# Altium footprint library Connector_Samtec_HLE_THT.PcbLib: 141 footprints (part 8 of 9) (continued)
## Samtec_HLE-143-02-xx-DV-TE_2x43_P2.54mm_Horizontal [mm]
pads (86):
  rrect19% 1.31x1.31 hole 0.71: 1(0,0)
  round 1.31 hole 0.71: 2(0,-2.54) 3(2.54,0) 4(2.54,-2.54) 5(5.08,0) 6(5.08,-2.54) 7(7.62,0) 8(7.62,-2.54) 9(10.16,0) 10(10.16,-2.54) 11(12.7,0) 12(12.7,-2.54) 13(15.24,0) 14(15.24,-2.54) 15(17.78,0) 16(17.78,-2.54) 17(20.32,0) 18(20.32,-2.54) 19(22.86,0) 20(22.86,-2.54) 21(25.4,0) 22(25.4,-2.54) 23(27.94,0) 24(27.94,-2.54) 25(30.48,0) 26(30.48,-2.54) 27(33.02,0) 28(33.02,-2.54) 29(35.56,0) 30(35.56,-2.54) 31(38.1,0) 32(38.1,-2.54) 33(40.64,0) 34(40.64,-2.54) 35(43.18,0) 36(43.18,-2.54) 37(45.72,0) 38(45.72,-2.54) 39(48.26,0) 40(48.26,-2.54) 41(50.8,0) 42(50.8,-2.54) 43(53.34,0) 44(53.34,-2.54) 45(55.88,0) 46(55.88,-2.54) 47(58.42,0) 48(58.42,-2.54) 49(60.96,0) 50(60.96,-2.54) 51(63.5,0) 52(63.5,-2.54) 53(66.04,0) 54(66.04,-2.54) 55(68.58,0) 56(68.58,-2.54) 57(71.12,0) 58(71.12,-2.54) 59(73.66,0) 60(73.66,-2.54) 61(76.2,0) 62(76.2,-2.54) 63(78.74,0) 64(78.74,-2.54) 65(81.28,0) 66(81.28,-2.54) 67(83.82,0) 68(83.82,-2.54) 69(86.36,0) 70(86.36,-2.54) 71(88.9,0) 72(88.9,-2.54) 73(91.44,0) 74(91.44,-2.54) 75(93.98,0) 76(93.98,-2.54) 77(96.52,0) 78(96.52,-2.54) 79(99.06,0) 80(99.06,-2.54) 81(101.6,0) 82(101.6,-2.54) 83(104.14,0) 84(104.14,-2.54) 85(106.68,0) 86(106.68,-2.54)
F.SilkS:
  lines w0.12: -1.38,-3.92 108.06,-3.92 108.06,1.38 -1.38,1.38 -1.38,-3.92
F.CrtYd:
  lines w0.05: -1.77,-4.31 108.45,-4.31 108.45,1.77 -1.77,1.77 -1.77,-4.31
F.Fab:
  lines w0.1: -0.5,1.27 0,0.563 0.5,1.27 ; -1.27,-3.81 107.95,-3.81 107.95,1.27 -1.27,1.27 -1.27,-3.81
  text "'.Designator'" at 49.293,-3.95 h1

## Samtec_HLE-144-02-xx-DV-PE-LC_2x44_P2.54mm_Horizontal [mm]
pads (178):
  rrect19% 1.31x1.31 hole 0.71: 1(0,0)
  round 1.31 hole 0.71: 2(0,-7.62) 3(2.54,0) 4(2.54,-7.62) 5(5.08,0) 6(5.08,-7.62) 7(7.62,0) 8(7.62,-7.62) 9(10.16,0) 10(10.16,-7.62) 11(12.7,0) 12(12.7,-7.62) 13(15.24,0) 14(15.24,-7.62) 15(17.78,0) 16(17.78,-7.62) 17(20.32,0) 18(20.32,-7.62) 19(22.86,0) 20(22.86,-7.62) 21(25.4,0) 22(25.4,-7.62) 23(27.94,0) 24(27.94,-7.62) 25(30.48,0) 26(30.48,-7.62) 27(33.02,0) 28(33.02,-7.62) 29(35.56,0) 30(35.56,-7.62) 31(38.1,0) 32(38.1,-7.62) 33(40.64,0) 34(40.64,-7.62) 35(43.18,0) 36(43.18,-7.62) 37(45.72,0) 38(45.72,-7.62) 39(48.26,0) 40(48.26,-7.62) 41(50.8,0) 42(50.8,-7.62) 43(53.34,0) 44(53.34,-7.62) 45(55.88,0) 46(55.88,-7.62) 47(58.42,0) 48(58.42,-7.62) 49(60.96,0) 50(60.96,-7.62) 51(63.5,0) 52(63.5,-7.62) 53(66.04,0) 54(66.04,-7.62) 55(68.58,0) 56(68.58,-7.62) 57(71.12,0) 58(71.12,-7.62) 59(73.66,0) 60(73.66,-7.62) 61(76.2,0) 62(76.2,-7.62) 63(78.74,0) 64(78.74,-7.62) 65(81.28,0) 66(81.28,-7.62) 67(83.82,0) 68(83.82,-7.62) 69(86.36,0) 70(86.36,-7.62) 71(88.9,0) 72(88.9,-7.62) 73(91.44,0) 74(91.44,-7.62) 75(93.98,0) 76(93.98,-7.62) 77(96.52,0) 78(96.52,-7.62) 79(99.06,0) 80(99.06,-7.62) 81(101.6,0) 82(101.6,-7.62) 83(104.14,0) 84(104.14,-7.62) 85(106.68,0) 86(106.68,-7.62) 87(109.22,0) 88(109.22,-7.62)
  round 1.4 hole 1.4: Un1(0,-2.54) Un2(12.7,-5.08) Un3(48.26,-5.08) Un4(40.64,-5.08) Un5(66.04,-2.54) Un6(88.9,-2.54) Un7(91.44,-5.08) Un8(71.12,-5.08) Un9(78.74,-2.54) Un10(76.2,-2.54) Un11(10.16,-2.54) Un12(10.16,-5.08) Un13(33.02,-5.08) Un14(53.34,-2.54) Un15(38.1,-2.54) Un16(25.4,-5.08) Un17(93.98,-2.54) Un18(22.86,-2.54) Un19(83.82,-2.54) Un20(43.18,-2.54) Un21(88.9,-5.08) Un22(20.32,-5.08) Un23(81.28,-5.08) Un24(15.24,-5.08) Un25(17.78,-5.08) Un26(68.58,-5.08) Un27(86.36,-5.08) Un28(109.22,-5.08) Un29(86.36,-2.54) Un30(17.78,-2.54) Un31(68.58,-2.54) Un32(73.66,-2.54) Un33(106.68,-5.08) Un34(27.94,-2.54) Un35(109.22,-2.54) Un36(5.08,-5.08) Un37(7.62,-2.54) Un38(15.24,-2.54) Un39(7.62,-5.08) Un40(50.8,-5.08) Un41(30.48,-2.54) Un42(99.06,-2.54) Un43(58.42,-2.54) Un44(25.4,-2.54) Un45(33.02,-2.54) Un46(43.18,-5.08) Un47(93.98,-5.08) Un48(91.44,-2.54) Un49(40.64,-2.54) Un50(99.06,-5.08) Un51(55.88,-2.54) Un52(22.86,-5.08) Un53(60.96,-5.08) Un54(0,-5.08) Un55(106.68,-2.54) Un56(53.34,-5.08) Un57(101.6,-2.54) Un58(76.2,-5.08) Un59(63.5,-2.54) Un61(2.54,-2.54) Un62(45.72,-5.08) Un63(55.88,-5.08) Un64(58.42,-5.08) Un65(71.12,-2.54) Un66(96.52,-5.08) Un67(35.56,-2.54) Un68(60.96,-2.54) Un69(63.5,-5.08) Un70(12.7,-2.54) Un71(5.08,-2.54) Un72(38.1,-5.08) Un73(78.74,-5.08) Un74(2.54,-5.08) Un75(66.04,-5.08) Un76(104.14,-2.54) Un77(20.32,-2.54) Un78(27.94,-5.08) Un79(104.14,-5.08) Un80(48.26,-2.54) Un81(35.56,-5.08) Un83(81.28,-2.54) Un84(96.52,-2.54) Un85(83.82,-5.08) Un86(30.48,-5.08) Un87(45.72,-2.54) Un88(50.8,-2.54) Un89(73.66,-5.08) Un90(101.6,-5.08)
  round 1.19 hole 1.19: Un60(107.95,-3.81) Un82(1.27,-3.81)
F.SilkS:
  lines w0.12: -1.38,-6.46 -1.38,-1.16 110.6,-1.16 110.6,-6.46 -1.38,-6.46
F.CrtYd:
  lines w0.05: -1.77,-8.78 110.99,-8.78 110.99,1.16 -1.77,1.16 -1.77,-8.78
F.Fab:
  lines w0.1: -0.5,-1.27 0,-1.977 0.5,-1.27 ; -1.27,-6.35 -1.27,-1.27 110.49,-1.27 110.49,-6.35 -1.27,-6.35
  text "'.Designator'" at 50.563,-6.49 h1

## Samtec_HLE-144-02-xx-DV-PE_2x44_P2.54mm_Horizontal [mm]
pads (176):
  rrect19% 1.31x1.31 hole 0.71: 1(0,0)
  round 1.31 hole 0.71: 2(0,-7.62) 3(2.54,0) 4(2.54,-7.62) 5(5.08,0) 6(5.08,-7.62) 7(7.62,0) 8(7.62,-7.62) 9(10.16,0) 10(10.16,-7.62) 11(12.7,0) 12(12.7,-7.62) 13(15.24,0) 14(15.24,-7.62) 15(17.78,0) 16(17.78,-7.62) 17(20.32,0) 18(20.32,-7.62) 19(22.86,0) 20(22.86,-7.62) 21(25.4,0) 22(25.4,-7.62) 23(27.94,0) 24(27.94,-7.62) 25(30.48,0) 26(30.48,-7.62) 27(33.02,0) 28(33.02,-7.62) 29(35.56,0) 30(35.56,-7.62) 31(38.1,0) 32(38.1,-7.62) 33(40.64,0) 34(40.64,-7.62) 35(43.18,0) 36(43.18,-7.62) 37(45.72,0) 38(45.72,-7.62) 39(48.26,0) 40(48.26,-7.62) 41(50.8,0) 42(50.8,-7.62) 43(53.34,0) 44(53.34,-7.62) 45(55.88,0) 46(55.88,-7.62) 47(58.42,0) 48(58.42,-7.62) 49(60.96,0) 50(60.96,-7.62) 51(63.5,0) 52(63.5,-7.62) 53(66.04,0) 54(66.04,-7.62) 55(68.58,0) 56(68.58,-7.62) 57(71.12,0) 58(71.12,-7.62) 59(73.66,0) 60(73.66,-7.62) 61(76.2,0) 62(76.2,-7.62) 63(78.74,0) 64(78.74,-7.62) 65(81.28,0) 66(81.28,-7.62) 67(83.82,0) 68(83.82,-7.62) 69(86.36,0) 70(86.36,-7.62) 71(88.9,0) 72(88.9,-7.62) 73(91.44,0) 74(91.44,-7.62) 75(93.98,0) 76(93.98,-7.62) 77(96.52,0) 78(96.52,-7.62) 79(99.06,0) 80(99.06,-7.62) 81(101.6,0) 82(101.6,-7.62) 83(104.14,0) 84(104.14,-7.62) 85(106.68,0) 86(106.68,-7.62) 87(109.22,0) 88(109.22,-7.62)
  round 1.4 hole 1.4: Un1(35.56,-2.54) Un2(81.28,-2.54) Un3(91.44,-5.08) Un4(106.68,-5.08) Un5(17.78,-2.54) Un6(25.4,-2.54) Un7(27.94,-5.08) Un8(33.02,-5.08) Un9(5.08,-5.08) Un10(96.52,-5.08) Un11(33.02,-2.54) Un12(73.66,-2.54) Un13(7.62,-2.54) Un14(99.06,-5.08) Un15(0,-5.08) Un16(99.06,-2.54) Un17(43.18,-5.08) Un18(93.98,-5.08) Un19(53.34,-2.54) Un20(66.04,-5.08) Un21(60.96,-5.08) Un22(35.56,-5.08) Un23(86.36,-5.08) Un24(55.88,-5.08) Un25(30.48,-5.08) Un26(63.5,-2.54) Un27(86.36,-2.54) Un28(60.96,-2.54) Un29(20.32,-5.08) Un30(50.8,-5.08) Un31(58.42,-2.54) Un32(58.42,-5.08) Un33(83.82,-5.08) Un34(88.9,-2.54) Un35(2.54,-2.54) Un36(71.12,-2.54) Un37(66.04,-2.54) Un38(2.54,-5.08) Un39(22.86,-5.08) Un40(30.48,-2.54) Un41(78.74,-2.54) Un42(45.72,-2.54) Un43(12.7,-5.08) Un44(5.08,-2.54) Un45(38.1,-2.54) Un46(73.66,-5.08) Un47(22.86,-2.54) Un48(109.22,-5.08) Un49(101.6,-2.54) Un50(104.14,-5.08) Un51(0,-2.54) Un52(38.1,-5.08) Un53(78.74,-5.08) Un54(106.68,-2.54) Un55(25.4,-5.08) Un56(15.24,-2.54) Un57(76.2,-2.54) Un58(93.98,-2.54) Un59(40.64,-5.08) Un60(101.6,-5.08) Un61(88.9,-5.08) Un62(109.22,-2.54) Un63(17.78,-5.08) Un64(104.14,-2.54) Un65(27.94,-2.54) Un66(45.72,-5.08) Un67(48.26,-5.08) Un68(68.58,-5.08) Un69(50.8,-2.54) Un70(40.64,-2.54) Un71(81.28,-5.08) Un72(20.32,-2.54) Un73(10.16,-2.54) Un74(83.82,-2.54) Un75(12.7,-2.54) Un76(76.2,-5.08) Un77(63.5,-5.08) Un78(43.18,-2.54) Un79(68.58,-2.54) Un80(7.62,-5.08) Un81(71.12,-5.08) Un82(55.88,-2.54) Un83(15.24,-5.08) Un84(53.34,-5.08) Un85(96.52,-2.54) Un86(10.16,-5.08) Un87(91.44,-2.54) Un88(48.26,-2.54)
F.SilkS:
  lines w0.12: -1.38,-6.46 -1.38,-1.16 110.6,-1.16 110.6,-6.46 -1.38,-6.46
F.CrtYd:
  lines w0.05: -1.77,-8.78 110.99,-8.78 110.99,1.16 -1.77,1.16 -1.77,-8.78
F.Fab:
  lines w0.1: -0.5,-1.27 0,-1.977 0.5,-1.27 ; -1.27,-6.35 -1.27,-1.27 110.49,-1.27 110.49,-6.35 -1.27,-6.35
  text "'.Designator'" at 50.563,-6.49 h1

## Samtec_HLE-144-02-xx-DV-TE_2x44_P2.54mm_Horizontal [mm]
pads (88):
  rrect19% 1.31x1.31 hole 0.71: 1(0,0)
  round 1.31 hole 0.71: 2(0,-2.54) 3(2.54,0) 4(2.54,-2.54) 5(5.08,0) 6(5.08,-2.54) 7(7.62,0) 8(7.62,-2.54) 9(10.16,0) 10(10.16,-2.54) 11(12.7,0) 12(12.7,-2.54) 13(15.24,0) 14(15.24,-2.54) 15(17.78,0) 16(17.78,-2.54) 17(20.32,0) 18(20.32,-2.54) 19(22.86,0) 20(22.86,-2.54) 21(25.4,0) 22(25.4,-2.54) 23(27.94,0) 24(27.94,-2.54) 25(30.48,0) 26(30.48,-2.54) 27(33.02,0) 28(33.02,-2.54) 29(35.56,0) 30(35.56,-2.54) 31(38.1,0) 32(38.1,-2.54) 33(40.64,0) 34(40.64,-2.54) 35(43.18,0) 36(43.18,-2.54) 37(45.72,0) 38(45.72,-2.54) 39(48.26,0) 40(48.26,-2.54) 41(50.8,0) 42(50.8,-2.54) 43(53.34,0) 44(53.34,-2.54) 45(55.88,0) 46(55.88,-2.54) 47(58.42,0) 48(58.42,-2.54) 49(60.96,0) 50(60.96,-2.54) 51(63.5,0) 52(63.5,-2.54) 53(66.04,0) 54(66.04,-2.54) 55(68.58,0) 56(68.58,-2.54) 57(71.12,0) 58(71.12,-2.54) 59(73.66,0) 60(73.66,-2.54) 61(76.2,0) 62(76.2,-2.54) 63(78.74,0) 64(78.74,-2.54) 65(81.28,0) 66(81.28,-2.54) 67(83.82,0) 68(83.82,-2.54) 69(86.36,0) 70(86.36,-2.54) 71(88.9,0) 72(88.9,-2.54) 73(91.44,0) 74(91.44,-2.54) 75(93.98,0) 76(93.98,-2.54) 77(96.52,0) 78(96.52,-2.54) 79(99.06,0) 80(99.06,-2.54) 81(101.6,0) 82(101.6,-2.54) 83(104.14,0) 84(104.14,-2.54) 85(106.68,0) 86(106.68,-2.54) 87(109.22,0) 88(109.22,-2.54)
F.SilkS:
  lines w0.12: -1.38,-3.92 110.6,-3.92 110.6,1.38 -1.38,1.38 -1.38,-3.92
F.CrtYd:
  lines w0.05: -1.77,-4.31 110.99,-4.31 110.99,1.77 -1.77,1.77 -1.77,-4.31
F.Fab:
  lines w0.1: -0.5,1.27 0,0.563 0.5,1.27 ; -1.27,-3.81 110.49,-3.81 110.49,1.27 -1.27,1.27 -1.27,-3.81
  text "'.Designator'" at 50.563,-3.95 h1

## Samtec_HLE-145-02-xx-DV-PE-LC_2x45_P2.54mm_Horizontal [mm]
pads (182):
  rrect19% 1.31x1.31 hole 0.71: 1(0,0)
  round 1.31 hole 0.71: 2(0,-7.62) 3(2.54,0) 4(2.54,-7.62) 5(5.08,0) 6(5.08,-7.62) 7(7.62,0) 8(7.62,-7.62) 9(10.16,0) 10(10.16,-7.62) 11(12.7,0) 12(12.7,-7.62) 13(15.24,0) 14(15.24,-7.62) 15(17.78,0) 16(17.78,-7.62) 17(20.32,0) 18(20.32,-7.62) 19(22.86,0) 20(22.86,-7.62) 21(25.4,0) 22(25.4,-7.62) 23(27.94,0) 24(27.94,-7.62) 25(30.48,0) 26(30.48,-7.62) 27(33.02,0) 28(33.02,-7.62) 29(35.56,0) 30(35.56,-7.62) 31(38.1,0) 32(38.1,-7.62) 33(40.64,0) 34(40.64,-7.62) 35(43.18,0) 36(43.18,-7.62) 37(45.72,0) 38(45.72,-7.62) 39(48.26,0) 40(48.26,-7.62) 41(50.8,0) 42(50.8,-7.62) 43(53.34,0) 44(53.34,-7.62) 45(55.88,0) 46(55.88,-7.62) 47(58.42,0) 48(58.42,-7.62) 49(60.96,0) 50(60.96,-7.62) 51(63.5,0) 52(63.5,-7.62) 53(66.04,0) 54(66.04,-7.62) 55(68.58,0) 56(68.58,-7.62) 57(71.12,0) 58(71.12,-7.62) 59(73.66,0) 60(73.66,-7.62) 61(76.2,0) 62(76.2,-7.62) 63(78.74,0) 64(78.74,-7.62) 65(81.28,0) 66(81.28,-7.62) 67(83.82,0) 68(83.82,-7.62) 69(86.36,0) 70(86.36,-7.62) 71(88.9,0) 72(88.9,-7.62) 73(91.44,0) 74(91.44,-7.62) 75(93.98,0) 76(93.98,-7.62) 77(96.52,0) 78(96.52,-7.62) 79(99.06,0) 80(99.06,-7.62) 81(101.6,0) 82(101.6,-7.62) 83(104.14,0) 84(104.14,-7.62) 85(106.68,0) 86(106.68,-7.62) 87(109.22,0) 88(109.22,-7.62) 89(111.76,0) 90(111.76,-7.62)
  round 1.4 hole 1.4: Un1(111.76,-5.08) Un2(53.34,-2.54) Un3(55.88,-2.54) Un4(76.2,-2.54) Un5(0,-5.08) Un6(66.04,-2.54) Un7(38.1,-2.54) Un8(45.72,-5.08) Un9(35.56,-5.08) Un10(33.02,-2.54) Un11(7.62,-2.54) Un12(76.2,-5.08) Un13(101.6,-2.54) Un14(20.32,-2.54) Un15(50.8,-5.08) Un16(109.22,-5.08) Un17(68.58,-5.08) Un18(66.04,-5.08) Un19(15.24,-5.08) Un20(40.64,-2.54) Un21(50.8,-2.54) Un22(68.58,-2.54) Un23(99.06,-2.54) Un24(5.08,-5.08) Un25(27.94,-2.54) Un26(48.26,-5.08) Un27(2.54,-2.54) Un28(81.28,-5.08) Un29(93.98,-2.54) Un30(91.44,-5.08) Un31(12.7,-2.54) Un32(5.08,-2.54) Un33(45.72,-2.54) Un34(71.12,-2.54) Un35(93.98,-5.08) Un36(91.44,-2.54) Un37(106.68,-5.08) Un38(53.34,-5.08) Un39(58.42,-5.08) Un40(83.82,-5.08) Un41(30.48,-2.54) Un42(7.62,-5.08) Un43(2.54,-5.08) Un44(10.16,-5.08) Un45(15.24,-2.54) Un46(99.06,-5.08) Un47(17.78,-5.08) Un48(25.4,-2.54) Un49(106.68,-2.54) Un50(88.9,-2.54) Un51(22.86,-5.08) Un52(81.28,-2.54) Un53(63.5,-5.08) Un54(60.96,-2.54) Un55(109.22,-2.54) Un56(40.64,-5.08) Un57(35.56,-2.54) Un58(25.4,-5.08) Un59(111.76,-2.54) Un60(88.9,-5.08) Un61(86.36,-2.54) Un62(20.32,-5.08) Un63(0,-2.54) Un64(43.18,-5.08) Un65(27.94,-5.08) Un66(10.16,-2.54) Un68(60.96,-5.08) Un69(104.14,-2.54) Un70(86.36,-5.08) Un71(22.86,-2.54) Un72(43.18,-2.54) Un73(30.48,-5.08) Un74(55.88,-5.08) Un75(71.12,-5.08) Un76(96.52,-2.54) Un77(101.6,-5.08) Un78(78.74,-5.08) Un79(83.82,-2.54) Un80(17.78,-2.54) Un81(38.1,-5.08) Un82(73.66,-2.54) Un83(63.5,-2.54) Un84(33.02,-5.08) Un85(73.66,-5.08) Un87(48.26,-2.54) Un88(78.74,-2.54) Un89(96.52,-5.08) Un90(12.7,-5.08) Un91(104.14,-5.08) Un92(58.42,-2.54)
  round 1.19 hole 1.19: Un67(110.49,-3.81) Un86(1.27,-3.81)
F.SilkS:
  lines w0.12: -1.38,-6.46 113.14,-6.46 113.14,-1.16 -1.38,-1.16 -1.38,-6.46
F.CrtYd:
  lines w0.05: -1.77,-8.78 113.53,-8.78 113.53,1.16 -1.77,1.16 -1.77,-8.78
F.Fab:
  lines w0.1: -0.5,-1.27 0,-1.977 0.5,-1.27 ; -1.27,-6.35 113.03,-6.35 113.03,-1.27 -1.27,-1.27 -1.27,-6.35
  text "'.Designator'" at 51.833,-6.49 h1

## Samtec_HLE-145-02-xx-DV-PE_2x45_P2.54mm_Horizontal [mm]
pads (180):
  rrect19% 1.31x1.31 hole 0.71: 1(0,0)
  round 1.31 hole 0.71: 2(0,-7.62) 3(2.54,0) 4(2.54,-7.62) 5(5.08,0) 6(5.08,-7.62) 7(7.62,0) 8(7.62,-7.62) 9(10.16,0) 10(10.16,-7.62) 11(12.7,0) 12(12.7,-7.62) 13(15.24,0) 14(15.24,-7.62) 15(17.78,0) 16(17.78,-7.62) 17(20.32,0) 18(20.32,-7.62) 19(22.86,0) 20(22.86,-7.62) 21(25.4,0) 22(25.4,-7.62) 23(27.94,0) 24(27.94,-7.62) 25(30.48,0) 26(30.48,-7.62) 27(33.02,0) 28(33.02,-7.62) 29(35.56,0) 30(35.56,-7.62) 31(38.1,0) 32(38.1,-7.62) 33(40.64,0) 34(40.64,-7.62) 35(43.18,0) 36(43.18,-7.62) 37(45.72,0) 38(45.72,-7.62) 39(48.26,0) 40(48.26,-7.62) 41(50.8,0) 42(50.8,-7.62) 43(53.34,0) 44(53.34,-7.62) 45(55.88,0) 46(55.88,-7.62) 47(58.42,0) 48(58.42,-7.62) 49(60.96,0) 50(60.96,-7.62) 51(63.5,0) 52(63.5,-7.62) 53(66.04,0) 54(66.04,-7.62) 55(68.58,0) 56(68.58,-7.62) 57(71.12,0) 58(71.12,-7.62) 59(73.66,0) 60(73.66,-7.62) 61(76.2,0) 62(76.2,-7.62) 63(78.74,0) 64(78.74,-7.62) 65(81.28,0) 66(81.28,-7.62) 67(83.82,0) 68(83.82,-7.62) 69(86.36,0) 70(86.36,-7.62) 71(88.9,0) 72(88.9,-7.62) 73(91.44,0) 74(91.44,-7.62) 75(93.98,0) 76(93.98,-7.62) 77(96.52,0) 78(96.52,-7.62) 79(99.06,0) 80(99.06,-7.62) 81(101.6,0) 82(101.6,-7.62) 83(104.14,0) 84(104.14,-7.62) 85(106.68,0) 86(106.68,-7.62) 87(109.22,0) 88(109.22,-7.62) 89(111.76,0) 90(111.76,-7.62)
  round 1.4 hole 1.4: Un1(55.88,-2.54) Un2(76.2,-2.54) Un3(96.52,-2.54) Un4(71.12,-5.08) Un5(91.44,-2.54) Un6(25.4,-5.08) Un7(63.5,-5.08) Un8(5.08,-2.54) Un9(111.76,-5.08) Un10(15.24,-2.54) Un11(60.96,-2.54) Un12(68.58,-5.08) Un13(48.26,-5.08) Un14(2.54,-2.54) Un15(17.78,-5.08) Un16(81.28,-2.54) Un17(109.22,-5.08) Un18(50.8,-5.08) Un19(45.72,-5.08) Un20(15.24,-5.08) Un21(30.48,-5.08) Un22(91.44,-5.08) Un23(68.58,-2.54) Un24(78.74,-5.08) Un25(81.28,-5.08) Un26(63.5,-2.54) Un27(0,-2.54) Un28(38.1,-5.08) Un29(2.54,-5.08) Un30(73.66,-2.54) Un31(101.6,-5.08) Un32(25.4,-2.54) Un33(58.42,-2.54) Un34(0,-5.08) Un35(40.64,-2.54) Un36(50.8,-2.54) Un37(27.94,-5.08) Un38(106.68,-2.54) Un39(76.2,-5.08) Un40(12.7,-5.08) Un41(60.96,-5.08) Un42(73.66,-5.08) Un43(22.86,-5.08) Un44(20.32,-5.08) Un45(88.9,-2.54) Un46(83.82,-5.08) Un47(38.1,-2.54) Un48(71.12,-2.54) Un49(55.88,-5.08) Un50(48.26,-2.54) Un51(27.94,-2.54) Un52(53.34,-5.08) Un53(40.64,-5.08) Un54(45.72,-2.54) Un55(106.68,-5.08) Un56(5.08,-5.08) Un57(7.62,-2.54) Un58(111.76,-2.54) Un59(53.34,-2.54) Un60(86.36,-2.54) Un61(88.9,-5.08) Un62(43.18,-2.54) Un63(12.7,-2.54) Un64(109.22,-2.54) Un65(22.86,-2.54) Un66(33.02,-2.54) Un67(99.06,-5.08) Un68(30.48,-2.54) Un69(10.16,-2.54) Un70(78.74,-2.54) Un71(96.52,-5.08) Un72(93.98,-5.08) Un73(104.14,-2.54) Un74(17.78,-2.54) Un75(101.6,-2.54) Un76(66.04,-2.54) Un77(7.62,-5.08) Un78(35.56,-2.54) Un79(99.06,-2.54) Un80(33.02,-5.08) Un81(58.42,-5.08) Un82(20.32,-2.54) Un83(86.36,-5.08) Un84(35.56,-5.08) Un85(93.98,-2.54) Un86(83.82,-2.54) Un87(43.18,-5.08) Un88(66.04,-5.08) Un89(10.16,-5.08) Un90(104.14,-5.08)
F.SilkS:
  lines w0.12: -1.38,-6.46 113.14,-6.46 113.14,-1.16 -1.38,-1.16 -1.38,-6.46
F.CrtYd:
  lines w0.05: -1.77,-8.78 -1.77,1.16 113.53,1.16 113.53,-8.78 -1.77,-8.78
F.Fab:
  lines w0.1: -0.5,-1.27 0,-1.977 0.5,-1.27 ; -1.27,-6.35 -1.27,-1.27 113.03,-1.27 113.03,-6.35 -1.27,-6.35
  text "'.Designator'" at 51.833,-6.49 h1

## Samtec_HLE-145-02-xx-DV-TE_2x45_P2.54mm_Horizontal [mm]
pads (90):
  rrect19% 1.31x1.31 hole 0.71: 1(0,0)
  round 1.31 hole 0.71: 2(0,-2.54) 3(2.54,0) 4(2.54,-2.54) 5(5.08,0) 6(5.08,-2.54) 7(7.62,0) 8(7.62,-2.54) 9(10.16,0) 10(10.16,-2.54) 11(12.7,0) 12(12.7,-2.54) 13(15.24,0) 14(15.24,-2.54) 15(17.78,0) 16(17.78,-2.54) 17(20.32,0) 18(20.32,-2.54) 19(22.86,0) 20(22.86,-2.54) 21(25.4,0) 22(25.4,-2.54) 23(27.94,0) 24(27.94,-2.54) 25(30.48,0) 26(30.48,-2.54) 27(33.02,0) 28(33.02,-2.54) 29(35.56,0) 30(35.56,-2.54) 31(38.1,0) 32(38.1,-2.54) 33(40.64,0) 34(40.64,-2.54) 35(43.18,0) 36(43.18,-2.54) 37(45.72,0) 38(45.72,-2.54) 39(48.26,0) 40(48.26,-2.54) 41(50.8,0) 42(50.8,-2.54) 43(53.34,0) 44(53.34,-2.54) 45(55.88,0) 46(55.88,-2.54) 47(58.42,0) 48(58.42,-2.54) 49(60.96,0) 50(60.96,-2.54) 51(63.5,0) 52(63.5,-2.54) 53(66.04,0) 54(66.04,-2.54) 55(68.58,0) 56(68.58,-2.54) 57(71.12,0) 58(71.12,-2.54) 59(73.66,0) 60(73.66,-2.54) 61(76.2,0) 62(76.2,-2.54) 63(78.74,0) 64(78.74,-2.54) 65(81.28,0) 66(81.28,-2.54) 67(83.82,0) 68(83.82,-2.54) 69(86.36,0) 70(86.36,-2.54) 71(88.9,0) 72(88.9,-2.54) 73(91.44,0) 74(91.44,-2.54) 75(93.98,0) 76(93.98,-2.54) 77(96.52,0) 78(96.52,-2.54) 79(99.06,0) 80(99.06,-2.54) 81(101.6,0) 82(101.6,-2.54) 83(104.14,0) 84(104.14,-2.54) 85(106.68,0) 86(106.68,-2.54) 87(109.22,0) 88(109.22,-2.54) 89(111.76,0) 90(111.76,-2.54)
F.SilkS:
  lines w0.12: -1.38,-3.92 113.14,-3.92 113.14,1.38 -1.38,1.38 -1.38,-3.92
F.CrtYd:
  lines w0.05: -1.77,-4.31 113.53,-4.31 113.53,1.77 -1.77,1.77 -1.77,-4.31
F.Fab:
  lines w0.1: -0.5,1.27 0,0.563 0.5,1.27 ; -1.27,-3.81 -1.27,1.27 113.03,1.27 113.03,-3.81 -1.27,-3.81
  text "'.Designator'" at 51.833,-3.95 h1

## Samtec_HLE-146-02-xx-DV-PE-LC_2x46_P2.54mm_Horizontal [mm]
pads (186):
  rrect19% 1.31x1.31 hole 0.71: 1(0,0)
  round 1.31 hole 0.71: 2(0,-7.62) 3(2.54,0) 4(2.54,-7.62) 5(5.08,0) 6(5.08,-7.62) 7(7.62,0) 8(7.62,-7.62) 9(10.16,0) 10(10.16,-7.62) 11(12.7,0) 12(12.7,-7.62) 13(15.24,0) 14(15.24,-7.62) 15(17.78,0) 16(17.78,-7.62) 17(20.32,0) 18(20.32,-7.62) 19(22.86,0) 20(22.86,-7.62) 21(25.4,0) 22(25.4,-7.62) 23(27.94,0) 24(27.94,-7.62) 25(30.48,0) 26(30.48,-7.62) 27(33.02,0) 28(33.02,-7.62) 29(35.56,0) 30(35.56,-7.62) 31(38.1,0) 32(38.1,-7.62) 33(40.64,0) 34(40.64,-7.62) 35(43.18,0) 36(43.18,-7.62) 37(45.72,0) 38(45.72,-7.62) 39(48.26,0) 40(48.26,-7.62) 41(50.8,0) 42(50.8,-7.62) 43(53.34,0) 44(53.34,-7.62) 45(55.88,0) 46(55.88,-7.62) 47(58.42,0) 48(58.42,-7.62) 49(60.96,0) 50(60.96,-7.62) 51(63.5,0) 52(63.5,-7.62) 53(66.04,0) 54(66.04,-7.62) 55(68.58,0) 56(68.58,-7.62) 57(71.12,0) 58(71.12,-7.62) 59(73.66,0) 60(73.66,-7.62) 61(76.2,0) 62(76.2,-7.62) 63(78.74,0) 64(78.74,-7.62) 65(81.28,0) 66(81.28,-7.62) 67(83.82,0) 68(83.82,-7.62) 69(86.36,0) 70(86.36,-7.62) 71(88.9,0) 72(88.9,-7.62) 73(91.44,0) 74(91.44,-7.62) 75(93.98,0) 76(93.98,-7.62) 77(96.52,0) 78(96.52,-7.62) 79(99.06,0) 80(99.06,-7.62) 81(101.6,0) 82(101.6,-7.62) 83(104.14,0) 84(104.14,-7.62) 85(106.68,0) 86(106.68,-7.62) 87(109.22,0) 88(109.22,-7.62) 89(111.76,0) 90(111.76,-7.62) 91(114.3,0) 92(114.3,-7.62)
  round 1.4 hole 1.4: Un1(43.18,-5.08) Un2(0,-5.08) Un3(25.4,-2.54) Un4(101.6,-2.54) Un5(99.06,-5.08) Un6(12.7,-5.08) Un7(114.3,-2.54) Un8(106.68,-2.54) Un9(111.76,-5.08) Un10(53.34,-2.54) Un11(88.9,-5.08) Un12(43.18,-2.54) Un13(58.42,-5.08) Un14(12.7,-2.54) Un15(25.4,-5.08) Un16(35.56,-2.54) Un17(73.66,-2.54) Un18(2.54,-2.54) Un19(38.1,-2.54) Un20(55.88,-2.54) Un21(76.2,-5.08) Un22(93.98,-5.08) Un23(99.06,-2.54) Un24(111.76,-2.54) Un25(2.54,-5.08) Un26(48.26,-5.08) Un27(114.3,-5.08) Un28(55.88,-5.08) Un29(10.16,-2.54) Un30(83.82,-2.54) Un31(86.36,-5.08) Un32(10.16,-5.08) Un33(53.34,-5.08) Un34(81.28,-2.54) Un35(109.22,-2.54) Un36(96.52,-2.54) Un38(60.96,-5.08) Un39(66.04,-5.08) Un40(0,-2.54) Un41(40.64,-2.54) Un42(71.12,-2.54) Un43(7.62,-5.08) Un44(71.12,-5.08) Un45(91.44,-2.54) Un46(38.1,-5.08) Un47(50.8,-2.54) Un48(66.04,-2.54) Un49(30.48,-2.54) Un50(93.98,-2.54) Un51(88.9,-2.54) Un52(60.96,-2.54) Un53(106.68,-5.08) Un54(76.2,-2.54) Un55(104.14,-5.08) Un56(78.74,-2.54) Un58(20.32,-5.08) Un59(63.5,-5.08) Un60(40.64,-5.08) Un61(81.28,-5.08) Un62(50.8,-5.08) Un63(68.58,-2.54) Un64(68.58,-5.08) Un65(5.08,-5.08) Un66(33.02,-2.54) Un67(86.36,-2.54) Un68(30.48,-5.08) Un69(17.78,-5.08) Un70(22.86,-2.54) Un71(48.26,-2.54) Un72(17.78,-2.54) Un73(83.82,-5.08) Un74(96.52,-5.08) Un75(104.14,-2.54) Un76(45.72,-5.08) Un77(78.74,-5.08) Un78(7.62,-2.54) Un79(27.94,-2.54) Un80(15.24,-5.08) Un81(63.5,-2.54) Un82(101.6,-5.08) Un83(73.66,-5.08) Un84(27.94,-5.08) Un85(58.42,-2.54) Un86(45.72,-2.54) Un87(22.86,-5.08) Un88(20.32,-2.54) Un89(91.44,-5.08) Un90(15.24,-2.54) Un91(109.22,-5.08) Un92(35.56,-5.08) Un93(33.02,-5.08) Un94(5.08,-2.54)
  round 1.19 hole 1.19: Un37(113.03,-3.81) Un57(1.27,-3.81)
F.SilkS:
  lines w0.12: -1.38,-6.46 115.68,-6.46 115.68,-1.16 -1.38,-1.16 -1.38,-6.46
F.CrtYd:
  lines w0.05: -1.77,-8.78 -1.77,1.16 116.07,1.16 116.07,-8.78 -1.77,-8.78
F.Fab:
  lines w0.1: -0.5,-1.27 0,-1.977 0.5,-1.27 ; -1.27,-6.35 -1.27,-1.27 115.57,-1.27 115.57,-6.35 -1.27,-6.35
  text "'.Designator'" at 53.103,-6.49 h1

## Samtec_HLE-146-02-xx-DV-PE_2x46_P2.54mm_Horizontal [mm]
pads (184):
  rrect19% 1.31x1.31 hole 0.71: 1(0,0)
  round 1.31 hole 0.71: 2(0,-7.62) 3(2.54,0) 4(2.54,-7.62) 5(5.08,0) 6(5.08,-7.62) 7(7.62,0) 8(7.62,-7.62) 9(10.16,0) 10(10.16,-7.62) 11(12.7,0) 12(12.7,-7.62) 13(15.24,0) 14(15.24,-7.62) 15(17.78,0) 16(17.78,-7.62) 17(20.32,0) 18(20.32,-7.62) 19(22.86,0) 20(22.86,-7.62) 21(25.4,0) 22(25.4,-7.62) 23(27.94,0) 24(27.94,-7.62) 25(30.48,0) 26(30.48,-7.62) 27(33.02,0) 28(33.02,-7.62) 29(35.56,0) 30(35.56,-7.62) 31(38.1,0) 32(38.1,-7.62) 33(40.64,0) 34(40.64,-7.62) 35(43.18,0) 36(43.18,-7.62) 37(45.72,0) 38(45.72,-7.62) 39(48.26,0) 40(48.26,-7.62) 41(50.8,0) 42(50.8,-7.62) 43(53.34,0) 44(53.34,-7.62) 45(55.88,0) 46(55.88,-7.62) 47(58.42,0) 48(58.42,-7.62) 49(60.96,0) 50(60.96,-7.62) 51(63.5,0) 52(63.5,-7.62) 53(66.04,0) 54(66.04,-7.62) 55(68.58,0) 56(68.58,-7.62) 57(71.12,0) 58(71.12,-7.62) 59(73.66,0) 60(73.66,-7.62) 61(76.2,0) 62(76.2,-7.62) 63(78.74,0) 64(78.74,-7.62) 65(81.28,0) 66(81.28,-7.62) 67(83.82,0) 68(83.82,-7.62) 69(86.36,0) 70(86.36,-7.62) 71(88.9,0) 72(88.9,-7.62) 73(91.44,0) 74(91.44,-7.62) 75(93.98,0) 76(93.98,-7.62) 77(96.52,0) 78(96.52,-7.62) 79(99.06,0) 80(99.06,-7.62) 81(101.6,0) 82(101.6,-7.62) 83(104.14,0) 84(104.14,-7.62) 85(106.68,0) 86(106.68,-7.62) 87(109.22,0) 88(109.22,-7.62) 89(111.76,0) 90(111.76,-7.62) 91(114.3,0) 92(114.3,-7.62)
  round 1.4 hole 1.4: Un1(2.54,-2.54) Un2(109.22,-5.08) Un3(101.6,-5.08) Un4(91.44,-5.08) Un5(114.3,-5.08) Un6(17.78,-5.08) Un7(20.32,-2.54) Un8(99.06,-5.08) Un9(0,-5.08) Un10(111.76,-2.54) Un11(81.28,-5.08) Un12(48.26,-2.54) Un13(33.02,-5.08) Un14(78.74,-5.08) Un15(93.98,-2.54) Un16(99.06,-2.54) Un17(93.98,-5.08) Un18(96.52,-2.54) Un19(101.6,-2.54) Un20(30.48,-5.08) Un21(45.72,-2.54) Un22(40.64,-2.54) Un23(53.34,-5.08) Un24(50.8,-2.54) Un25(106.68,-5.08) Un26(12.7,-5.08) Un27(66.04,-2.54) Un28(104.14,-5.08) Un29(86.36,-2.54) Un30(109.22,-2.54) Un31(43.18,-5.08) Un32(48.26,-5.08) Un33(60.96,-2.54) Un34(106.68,-2.54) Un35(15.24,-2.54) Un36(111.76,-5.08) Un37(20.32,-5.08) Un38(53.34,-2.54) Un39(27.94,-5.08) Un40(22.86,-5.08) Un41(15.24,-5.08) Un42(83.82,-5.08) Un43(22.86,-2.54) Un44(35.56,-5.08) Un45(60.96,-5.08) Un46(43.18,-2.54) Un47(40.64,-5.08) Un48(55.88,-5.08) Un49(2.54,-5.08) Un50(73.66,-2.54) Un51(66.04,-5.08) Un52(5.08,-2.54) Un53(35.56,-2.54) Un54(38.1,-2.54) Un55(91.44,-2.54) Un56(25.4,-2.54) Un57(58.42,-2.54) Un58(76.2,-2.54) Un59(83.82,-2.54) Un60(33.02,-2.54) Un61(5.08,-5.08) Un62(96.52,-5.08) Un63(58.42,-5.08) Un64(114.3,-2.54) Un65(45.72,-5.08) Un66(88.9,-2.54) Un67(63.5,-5.08) Un68(38.1,-5.08) Un69(68.58,-5.08) Un70(63.5,-2.54) Un71(0,-2.54) Un72(12.7,-2.54) Un73(17.78,-2.54) Un74(10.16,-2.54) Un75(30.48,-2.54) Un76(88.9,-5.08) Un77(68.58,-2.54) Un78(78.74,-2.54) Un79(104.14,-2.54) Un80(76.2,-5.08) Un81(50.8,-5.08) Un82(71.12,-5.08) Un83(10.16,-5.08) Un84(7.62,-2.54) Un85(27.94,-2.54) Un86(73.66,-5.08) Un87(86.36,-5.08) Un88(25.4,-5.08) Un89(7.62,-5.08) Un90(71.12,-2.54) Un91(55.88,-2.54) Un92(81.28,-2.54)
F.SilkS:
  lines w0.12: -1.38,-6.46 -1.38,-1.16 115.68,-1.16 115.68,-6.46 -1.38,-6.46
F.CrtYd:
  lines w0.05: -1.77,-8.78 -1.77,1.16 116.07,1.16 116.07,-8.78 -1.77,-8.78
F.Fab:
  lines w0.1: -0.5,-1.27 0,-1.977 0.5,-1.27 ; -1.27,-6.35 -1.27,-1.27 115.57,-1.27 115.57,-6.35 -1.27,-6.35
  text "'.Designator'" at 53.103,-6.49 h1